# Altium footprint library Connectors.PcbLib: 135 footprints (part 9 of 9)
Each footprint in its own frame and in the unit in brackets; x right, y up, seen from the top. Pads: shape width x height; smd on the part's side, far side on the other; paste and mask are expansions set on the pad; w line width, h text height; cw(c..) or ccw(c..) is an arc to the next point about the centre after c.
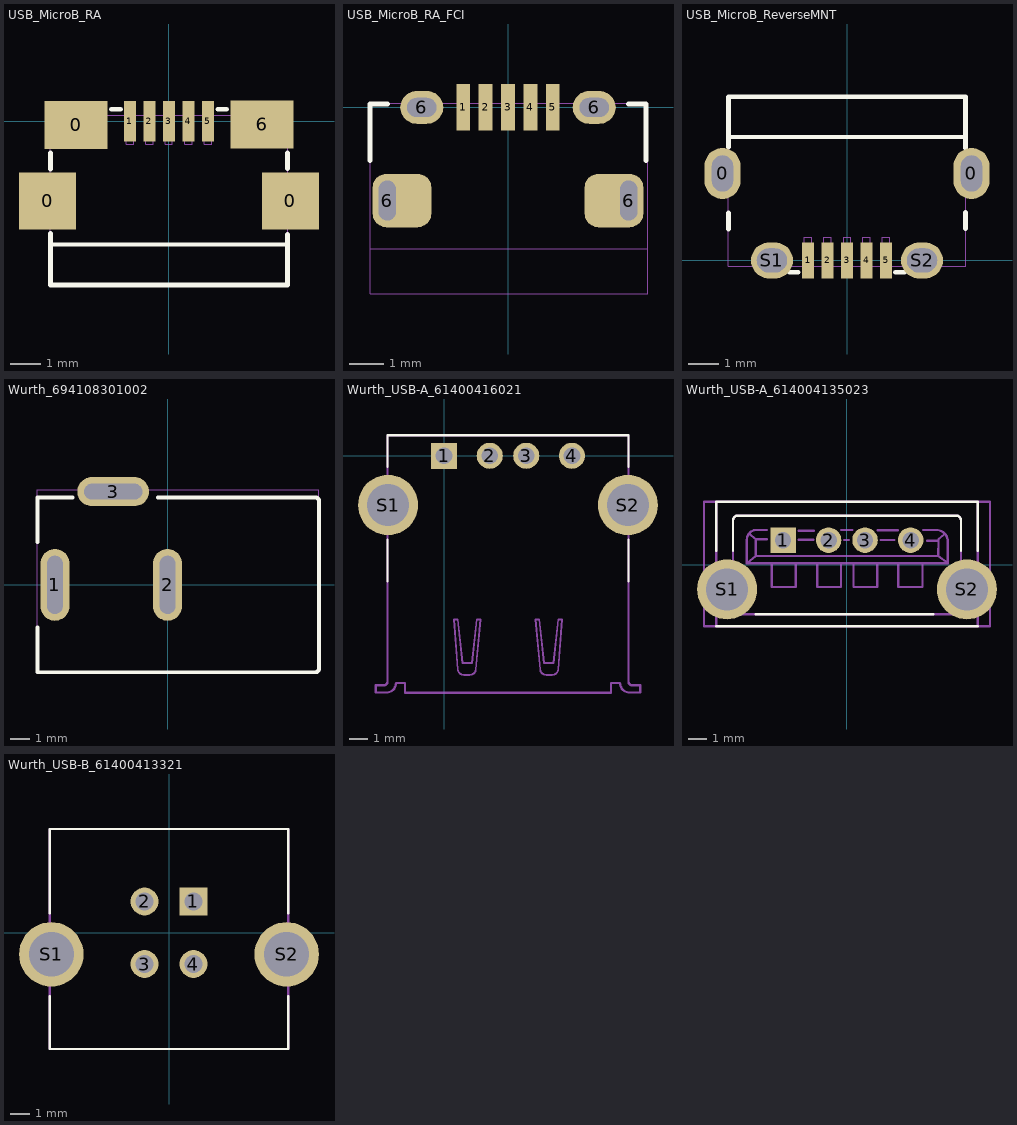
[diagram p8: the footprints below, top view; thin cyan lines are the x and y axes]

## USB_MicroB_RA [mm] "USB micro Type B Standard connector SMT  - HIROSE"
height 2.8
pads (9):
  rect 1.9x1.9 smd: 0(-4.05,-2.659) 0(4.05,-2.659)
  rect 2.1x1.6 smd: 0(-3.1,-0.124) 6(3.1,-0.109)
  rect 0.4x1.35 smd: 1(-1.3,0) 2(-0.65,0) 3(0,0) 4(0.65,0) 5(1.3,0)
Top Overlay:
  lines w0.127: -3.956,-4.108 3.957,-4.108
  lines w0.152: -3.956,-5.459 3.95,-5.459 ; -3.95,-5.459 -3.95,-3.737 ; -3.95,-1.595 -3.95,-1.053 ; -1.927,0.397 -1.612,0.397 ; 1.63,0.397 1.927,0.397 ; 3.95,-5.451 3.95,-3.763 ; 3.95,-1.578 3.95,-1.045
Mechanical 1:
  lines w0.025: -3.957,-5.406 3.956,-5.406 3.956,0.203 -3.957,0.203 -3.957,-5.406 ; -1.42,-0.762 -1.42,0.254 -1.18,0.254 -1.18,-0.762 -1.42,-0.762 ; -0.77,-0.762 -0.53,-0.762 -0.53,0.254 -0.77,0.254 -0.77,-0.762 ; -0.127,-0.762 0.113,-0.762 0.113,0.254 -0.127,0.254 -0.127,-0.762 ; 0.53,-0.762 0.77,-0.762 0.77,0.254 0.53,0.254 0.53,-0.762 ; 1.18,-0.762 1.42,-0.762 1.42,0.254 1.18,0.254 1.18,-0.762
  text ".Designator" at -2.032,-3.683 h1.52
3D body "USB_MicroB_FCI.step": height 2.75, standoff -0.26, extent -3.957,-5.406 3.956,0.254

## USB_MicroB_RA_FCI [mm] "USB micro Type B Standard connector SMT  - FCI"
height 2.8
pads (9):
  rect 0.4x1.35 smd: 1(-1.3,0) 2(-0.65,0) 3(0,0) 4(0.65,0) 5(1.3,0)
  rrect50% 1.7x1.55 hole 0.5 slot 1.15 at 90 deg copper offset 0.425,0: 6(-3.5,-2.7)
  oval 1.25x0.95 hole 0.55 slot 0.85 at 0 deg: 6(-2.5,0) 6(2.5,0)
  rrect50% 1.7x1.55 hole 0.5 slot 1.15 at 90 deg copper offset -0.425,0: 6(3.5,-2.7)
Top Overlay:
  lines w0.152: -4,-1.542 -4,0.1 -3.5,0.1 ; 3.5,0.1 4,0.1 4,-1.542
Mechanical 1:
  lines w0.025: -4,-4.1 4.05,-4.1 ; -4,-5.406 4.05,-5.406 4.05,0.125 -4,0.125 -4,-5.406 ; -1.42,-0.462 -1.42,0.554 -1.18,0.554 -1.18,-0.462 -1.42,-0.462 ; -0.77,-0.462 -0.53,-0.462 -0.53,0.554 -0.77,0.554 -0.77,-0.462 ; -0.127,-0.462 0.113,-0.462 0.113,0.554 -0.127,0.554 -0.127,-0.462 ; 0.53,-0.462 0.77,-0.462 0.77,0.554 0.53,0.554 0.53,-0.462 ; 1.18,-0.462 1.42,-0.462 1.42,0.554 1.18,0.554 1.18,-0.462
  text ".Designator" at -1.8,-2.7 h1.52
3D body "FCI_MicroUSB_TH_10118194-001lfc.stp": height 2.67, standoff -0.6, extent -4.008,-5.405 4.042,0.125

## USB_MicroB_ReverseMNT [mm] "USB micro Type B Reverse mount JAE"
height 2.8
pads (9):
  oval 1.2x1.7 hole 0.7 slot 1.2 at 90 deg: 0(-4.15,2.896) 0(4.15,2.896)
  rect 0.4x1.2 smd: 1(-1.3,0) 2(-0.65,0) 3(0,0) 4(0.65,0) 5(1.3,0)
  oval 1.4x1.2 hole 0.8 slot 1 at 0 deg: S1(-2.5,-0.004) S2(2.5,-0.004)
Top Overlay:
  lines w0.127: -3.957,4.108 3.956,4.108
  lines w0.152: -3.95,1.045 -3.95,1.578 ; -3.95,3.763 -3.95,5.451 ; -3.95,5.459 3.956,5.459 ; -1.927,-0.397 -1.63,-0.397 ; 1.612,-0.397 1.927,-0.397 ; 3.95,1.053 3.95,1.595 ; 3.95,3.737 3.95,5.459
Mechanical 1:
  lines w0.025: -3.956,-0.203 3.957,-0.203 3.957,5.406 -3.956,5.406 -3.956,-0.203 ; -1.42,-0.254 -1.42,0.762 -1.18,0.762 -1.18,-0.254 -1.42,-0.254 ; -0.77,-0.254 -0.77,0.762 -0.53,0.762 -0.53,-0.254 -0.77,-0.254 ; -0.113,-0.254 -0.113,0.762 0.127,0.762 0.127,-0.254 -0.113,-0.254 ; 0.53,-0.254 0.53,0.762 0.77,0.762 0.77,-0.254 0.53,-0.254 ; 1.18,-0.254 1.42,-0.254 1.42,0.762 1.18,0.762 1.18,-0.254
  text ".Designator" at -8.255,-3.302 h1.52
3D body "USB_MicroB_JAE_reverse mount.step.stp": height 2.78, standoff -0.6, extent -4.3,-0.254 4.3,5.446

## Wurth_694108301002 [mm] "WR-DC_DC Power Jack_Right Angled_THT Center Pin ?2.5_Plug ID ?2.05_Plug OD ?5.5"
height 10.7
pads (3):
  oval 1.5x3.7 hole 0.8 slot 3 at 90 deg: 1(-5.8,0) 2(0,0)
  oval 3.7x1.5 hole 0.8 slot 3 at 0 deg: 3(-2.8,4.8)
Top Overlay:
  lines w0.2: -6.7,-2.2 -6.7,-4.5 7.6,-4.5 ccw(c7.612,-4.312) 7.8,-4.3 7.8,4.3 ccw(c7.612,4.312) 7.6,4.5 -0.5,4.5 ; -6.7,2.2 -6.7,4.5 -4.9,4.5
Mechanical 1:
  lines w0.025: -6.7,-4.5 -6.7,4.9 7.8,4.9 7.8,-4.5 -6.7,-4.5
  text ".Designator" at -4.699,6.35 h1.52
3D body "694108301002.stp": height 10.7, standoff -3.8, extent -6.7,-4.5 7.8,4.9

## Wurth_USB-A_61400416021 [mm] "4 pins"
height 6.95
pads (6):
  rect 1.428x1.428 hole 0.92: 1(0,0)
  round 1.428 hole 0.92: 2(2.5,0) 3(4.5,0) 4(7,0)
  round 3.3 hole 2.3: S1(-3.07,-2.7) S2(10.07,-2.7)
Top Overlay:
  lines w0.127: -3.101,-6.87 -3.101,-4.6 ; -3.1,-0.6 -3.1,1.12 10.1,1.12 10.1,-0.6 ; 10.099,-6.87 10.099,-4.6
Mechanical 1:
  lines w0.102: 0.956,-11.978 cw(c1.042,-11.696) 0.749,-11.719 0.541,-8.967 0.749,-8.967 1.008,-11.355 1.527,-11.355 1.787,-8.967 1.994,-8.967 1.735,-11.719 cw(c1.441,-11.696) 1.527,-11.978 ; 0.956,-11.978 ccw(c1.242,-11.047) 1.527,-11.978 ; 5.472,-11.978 cw(c5.559,-11.696) 5.265,-11.719 5.005,-8.967 5.213,-8.967 5.472,-11.355 5.992,-11.355 6.251,-8.967 6.459,-8.967 6.251,-11.719 cw(c5.957,-11.696) 6.044,-11.978 ; 5.472,-11.978 ccw(c5.758,-11.047) 6.043,-11.978
  lines w0.127: -3.101,-4.251 -3.101,-12.383 cw(c-3.298,-12.383) -3.298,-12.58 -3.75,-12.58 -3.75,-12.975 -3.167,-12.975 ccw(c-3.167,-12.448) -2.64,-12.448 -2.14,-12.448 -2.14,-12.98 9.14,-12.98 9.14,-12.448 9.64,-12.448 ccw(c10.166,-12.448) 10.166,-12.975 10.75,-12.975 10.75,-12.58 10.298,-12.58 cw(c10.298,-12.383) 10.101,-12.383 10.101,-4.251 ; -3.1,-1.15 -3.1,1.12 10.1,1.12 10.1,-1.15
  text ".Designator" at 1,-6 h1.52
3D body "61400416021.stp": height 7.71, standoff -3.69, extent -4.402,-12.98 11.401,1.12

## Wurth_USB-A_614004135023 [mm] "4 pins"
height 14.9
pads (6):
  rect 1.4x1.4 hole 0.9: 1(-3.51,1.35)
  round 1.4 hole 0.9: 2(-1.01,1.35) 3(0.99,1.35) 4(3.49,1.35)
  round 3.3 hole 2.3: S1(-6.58,-1.35) S2(6.58,-1.35)
Top Overlay:
  lines w0.127: -7.175,-3.38 7.175,-3.38 ; -7.175,0.75 -7.175,3.46 7.175,3.46 7.175,0.75 ; -6.25,0.75 -6.25,2.445 cw(c-6,2.445) -6,2.695 6,2.695 cw(c6,2.445) 6.25,2.445 6.25,0.75 ; -5,-2.725 4.75,-2.725
Mechanical 1:
  lines w0.127: -7.175,-2.815 -7.175,-3.38 7.175,-3.38 7.175,-2.785 ; -7.175,0.115 -7.175,3.46 7.175,3.46 7.175,0.115 ; -6.25,0.17 -6.25,2.445 cw(c-6,2.445) -6,2.695 6,2.695 cw(c6,2.445) 6.25,2.445 6.25,0.17 ; -6.03,-2.725 6,-2.725 ; -5.345,1.696 -5.002,1.396 ; -4.4,1.91 -4.959,1.91 ccw(c-4.959,1.374) -5.494,1.374 -5.494,0.089 -5.473,0.089 ; -4.396,1.396 -5.002,1.396 ; -4.124,0.068 -4.124,-1.217 -2.817,-1.217 -2.817,0.068 ; -2.66,1.87 -1.81,1.87 ; -2.65,1.37 -1.86,1.37 ; -1.639,0.068 -1.639,-1.217 -0.333,-1.217 -0.333,0.046 ; -0.32,1.91 0.3,1.91 ; -0.16,1.36 0.11,1.36 ; 0.353,0.025 0.353,-1.217 1.659,-1.217 1.659,0.068 1.681,0.068 ; 1.68,1.9 2.79,1.9 ; 1.85,1.36 2.6,1.36 ; 2.816,0.046 2.816,-1.217 4.144,-1.217 4.144,0.046 ; 4.19,1.91 4.893,1.91 cw(c4.893,1.267) 5.536,1.267 5.536,0.089 ; 4.39,1.32 5.02,1.32 ; 5.343,1.674 5.022,1.396 5,0.475 ; -5.473,0.089 -5.002,0.475 ; -5.473,0.089 5.536,0.089 ; -5.002,0.475 -5.002,1.396 ; -5.002,0.475 5,0.475 ; 5,0.475 5.536,0.089
  text ".Designator" at -3.25,4 h1.52
Mechanical 15:
  lines w0.127: -7.85,-3.38 7.85,-3.38 7.85,3.46 -7.85,3.46 -7.85,-3.38
3D body "614004135023.stp": height 3.47, standoff -15.33, extent -7.85,-3.38 7.85,3.46

## Wurth_USB-B_61400413321 [mm] "F Str 04p Btype vertical"
height 16.1
pads (6):
  rect 1.428x1.428 hole 0.92: 1(1.25,1.6)
  round 1.428 hole 0.92: 2(-1.25,1.6) 3(-1.25,-1.6) 4(1.25,-1.6)
  round 3.3 hole 2.3: S1(-6.02,-1.1) S2(6.02,-1.1)
Top Overlay:
  lines w0.127: -6.1,-3.25 -6.1,-5.945 6.1,-5.945 6.1,-3.25 ; -6.1,1 -6.1,5.305 6.1,5.305 6.1,1
Mechanical 1:
  circle w0.127: c-6.02,-1.1 r1.27
  circle w0.127: c5.75,-1.1 r1.27
  lines w0.127: -6.1,-5.945 6.1,-5.945 6.1,5.305 -6.1,5.305 -6.1,-5.945
  text ".Designator" at -1.75,6 h1.52
3D body "61400413321.stp": height 16.11, standoff -4.79, extent -7.345,-5.87 7.355,5.33